# Altium footprint library Footprints.PcbLib: 196 footprints (part 10 of 13)
Each footprint in its own frame and in the unit in brackets; x right, y up, seen from the top. Pads: shape width x height; smd on the part's side, far side on the other; paste and mask are expansions set on the pad; w line width, h text height; cw(c..) or ccw(c..) is an arc to the next point about the centre after c.
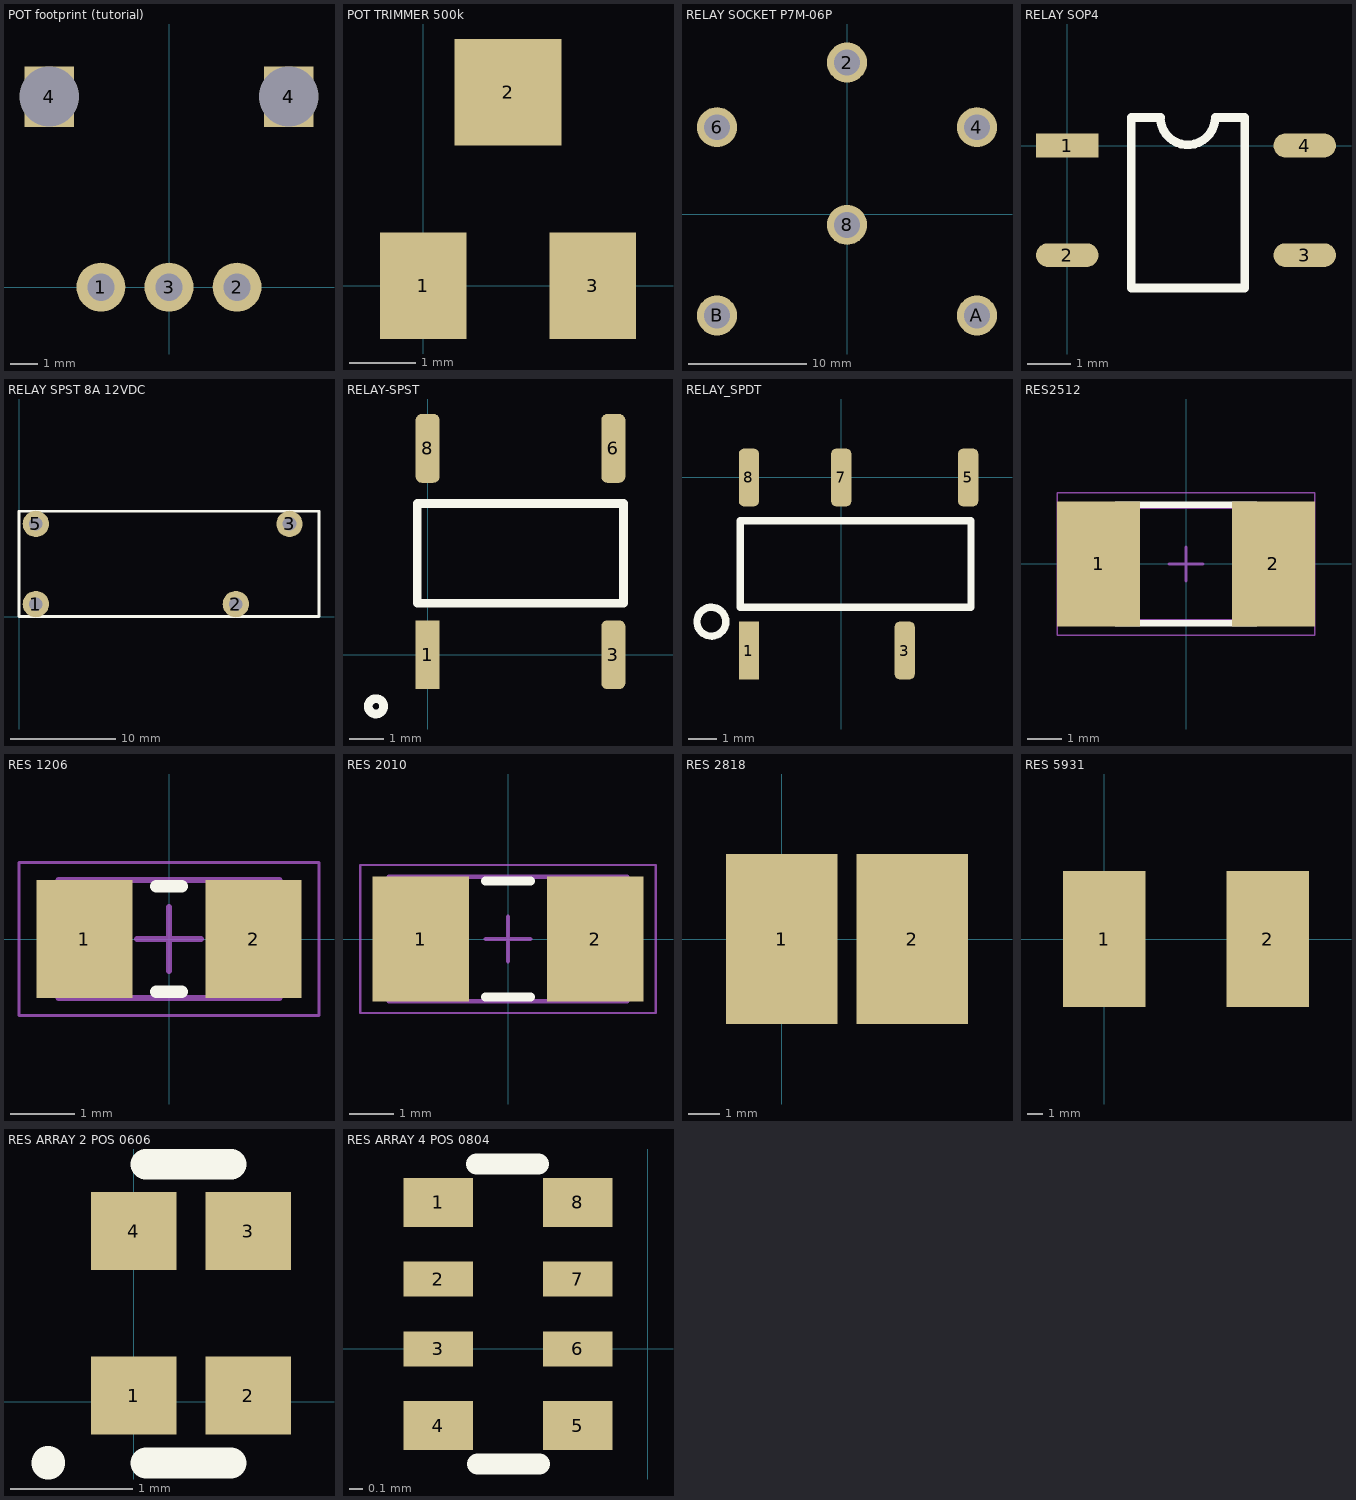
[diagram p9: the footprints below, top view; thin cyan lines are the x and y axes]

## PCBComponent_1 - duplicate1 [mm]

## PCBComponent_1 - duplicate2 [mm]

## POT footprint (tutorial) [mm] "ape"
pads (6):
  round 1.8 hole 1: 1(-2.5,0) 2(2.5,0) 3(0,0)
  rect 1.82x2.22 hole 2.2 square: 4(-4.4,7) 4(4.4,7) 4(4.4,7)
3D body: height 7.15, standoff -5.5, extent 0,2.5 0,2.5
3D body "ptv09a-4x15f-xxxx.stp": height 14.5, standoff -4.49, extent -5.7,0 5.7,12.65

## POT TRIMMER 500k [mm] "TRIMMER 500K OHM 0.25W SMD"
pads (3):
  rect 1.3x1.6 smd mask+0.076: 1(0,0)
  rect 1.6x1.6 smd: 2(1.27,2.9)
  rect 1.3x1.6 smd: 3(2.54,0)
3D body: height 0.25, standoff 0, extent 0,2.54 0,2.54
3D body "SM-42TW500k_(504).stp": height 5.3, standoff 0, extent -1.13,-0.45 3.67,3.45

## RELAY SOCKET P7M-06P [mm]
pads (6):
  round 3.4 hole 2.2: 2(0,12.9) 4(11.05,7.4) 6(-11.05,7.4) 8(0,-0.9) A(11.05,-8.6) B(-11.05,-8.6)
3D body: height 64, standoff 0, extent -19.5,-21.5 19.5,21.5

## RELAY SOP4 [mm]
pads (4):
  rect 1.45x0.55 smd: 1(0,0)
  oval 1.45x0.55 smd: 2(0,-2.54) 3(5.5,-2.54) 4(5.5,0)
Top Overlay:
  lines w0.2: 2.155,0.65 ccw(c2.79,0.65) 3.425,0.65 ; 2.165,0.65 1.485,0.65 1.485,-3.3 4.115,-3.3 4.115,0.65 3.475,0.65
3D body "User Library-SOP-4.step": height 2.02, standoff -0.02, extent -0.73,-3.3 6.13,0.7

## RELAY SPST 8A 12VDC [mm]
pads (4):
  round 2.5 hole 1.3: 1(1.6,1.19) 2(20.6,1.19) 3(25.7,8.81) 5(1.6,8.81)
Top Overlay:
  lines w0.254: 0,0.01 0,10.01 28.5,10.01 28.5,0.01 0,0.01
3D body "G6RN_1A.x_t": height 15, standoff -3.5, extent 0,0.01 28.5,10.01

## RELAY-SPST [mm]
pads (4):
  rect 0.7x2 smd: 1(0,0)
  rrect50% 0.7x2 smd: 3(5.4,0) 6(5.4,6) 8(0,6)
Top Overlay:
  circle w0.254: c-1.5,-1.5 r0.224
  lines w0.254: -0.3,1.5 5.7,1.5 5.7,4.4 -0.3,4.4 -0.3,1.5
3D body: height 5.65, standoff 0, extent -0.299,1.501 5.699,4.399

## RELAY_SPDT [mm]
pads (5):
  rect 0.7x2 smd: 1(-3.2,-6)
  rrect50% 0.7x2 smd: 3(2.2,-6) 5(4.4,0) 7(0,0) 8(-3.2,0)
Top Overlay:
  circle w0.254: c-4.5,-5 r0.5
  lines w0.254: -3.5,-4.5 4.5,-4.5 4.5,-1.5 -3.5,-1.5 -3.5,-2.25 -3.5,-3.75 -3.5,-4.5
3D body: height 5.65, standoff 0, extent -3.499,-4.499 4.499,-1.501

## RES2512 [mm]
height 0.65
pads (2):
  rect 2.45x3.7 smd: 1(-2.575,0) 2(2.575,0)
Top Overlay:
  lines w0.2: -2.05,-1.75 2.05,-1.75 ; -2.05,1.75 2.05,1.75
Mechanical 13:
  lines w0.1: -3.175,-1.675 -3.175,1.675 3.175,1.675 3.175,-1.675 -3.175,-1.675
Mechanical 15:
  lines w0.05: -3.8,-2.1 -3.8,2.1 3.8,2.1 3.8,-2.1 -3.8,-2.1
  lines w0.1: -0.5,0 0.5,0 ; 0,-0.5 0,0.5
3D body "RES2512.step": height 0.65, standoff 0, extent -3.175,-1.675 3.175,1.675

## RES 1206 [mm] "Chip Resistor, 2-Leads, Body 3.20x1.60mm, IPC Medium Density"
height 0.64
pads (2):
  rect 1.5x1.85 smd: 1(-1.325,0) 2(1.325,0)
Top Overlay:
  lines w0.2: -0.2,-0.825 0.2,-0.825 ; -0.2,0.825 0.2,0.825
Mechanical 13:
  lines w0.1: -1.725,-0.925 1.725,-0.925 1.725,0.925 -1.725,0.925 -1.725,-0.925
Mechanical 15:
  lines w0.05: -2.35,-1.2 2.35,-1.2 2.35,1.2 -2.35,1.2 -2.35,-1.2
  lines w0.1: -0.5,0 0.5,0 ; 0,-0.5 0,0.5
3D body "RES 1206.step": height 0.64, standoff 0, extent -1.725,-0.925 1.725,0.925

## RES 2010 [mm] "Chip Resistor, 2-Leads, Body 5.08x2.54mm, IPC Medium Density"
height 1.04
pads (2):
  rect 2.15x2.8 smd: 1(-1.95,0) 2(1.95,0)
Top Overlay:
  lines w0.2: -0.5,-1.3 0.5,-1.3 ; -0.5,1.3 0.5,1.3
Mechanical 13:
  lines w0.1: -2.665,-1.395 -2.665,1.395 2.665,1.395 2.665,-1.395 -2.665,-1.395
Mechanical 15:
  lines w0.05: -3.3,-1.65 -3.3,1.65 3.3,1.65 3.3,-1.65 -3.3,-1.65
  lines w0.1: -0.5,0 0.5,0 ; 0,-0.5 0,0.5
3D body "RES 2010.step": height 1.04, standoff 0, extent -2.665,-1.395 2.665,1.395

## RES 2818 [mm]
pads (2):
  rect 3.51x5.33 smd: 1(0,0) 2(4.1,0)
3D body "WSHM2818.stp": height 1.35, standoff -0.15, extent -1.525,-2.325 5.575,2.275

## RES 5931 [mm]
pads (2):
  rect 5.45x9 smd: 1(0,0) 2(10.8,0)
3D body "WSL5931 (0.003).stp": height 0.77, standoff 0, extent -2.25,-4 12.75,3.75

## RES ARRAY 2 POS 0606 [mm]
pads (4):
  rect 0.7x0.64 smd: 1(0,0.05) 2(0.94,0.05) 3(0.94,1.4) 4(0,1.4)
Top Overlay:
  circle w0.254: c-0.7,-0.5 r0.01
  lines w0.254: 0.1,-0.5 0.8,-0.5 ; 0.1,1.95 0.8,1.95
3D body "ACAS_0606.stp": height 0.45, standoff 0, extent -0.281,-0.072 1.219,1.528

## RES ARRAY 4 POS 0804 [mm] "Panasonic Electronic Components EXB-N8V511JX"
height 0.7
pads (8):
  rect 0.5x0.35 smd: 1(-1.5,1.05) 4(-1.5,-0.55) 5(-0.5,-0.55) 8(-0.5,1.05)
  rect 0.5x0.25 smd: 2(-1.5,0.5) 3(-1.5,0) 6(-0.5,0) 7(-0.5,0.5)
Top Overlay:
  lines w0.152: -1.225,1.325 -0.781,1.325 ; -1.219,-0.825 -0.775,-0.825
3D body "User Library-4xRes_0402.step": height 0.36, standoff -0.01, extent -1.5,-0.75 -0.5,1.25